# Altium footprint library PCB封装库.PcbLib: 77 footprints (part 1 of 5)
Each footprint in its own frame and in the unit in brackets; x right, y up, seen from the top. Pads: shape width x height; smd on the part's side, far side on the other; paste and mask are expansions set on the pad; w line width, h text height; cw(c..) or ccw(c..) is an arc to the next point about the centre after c.
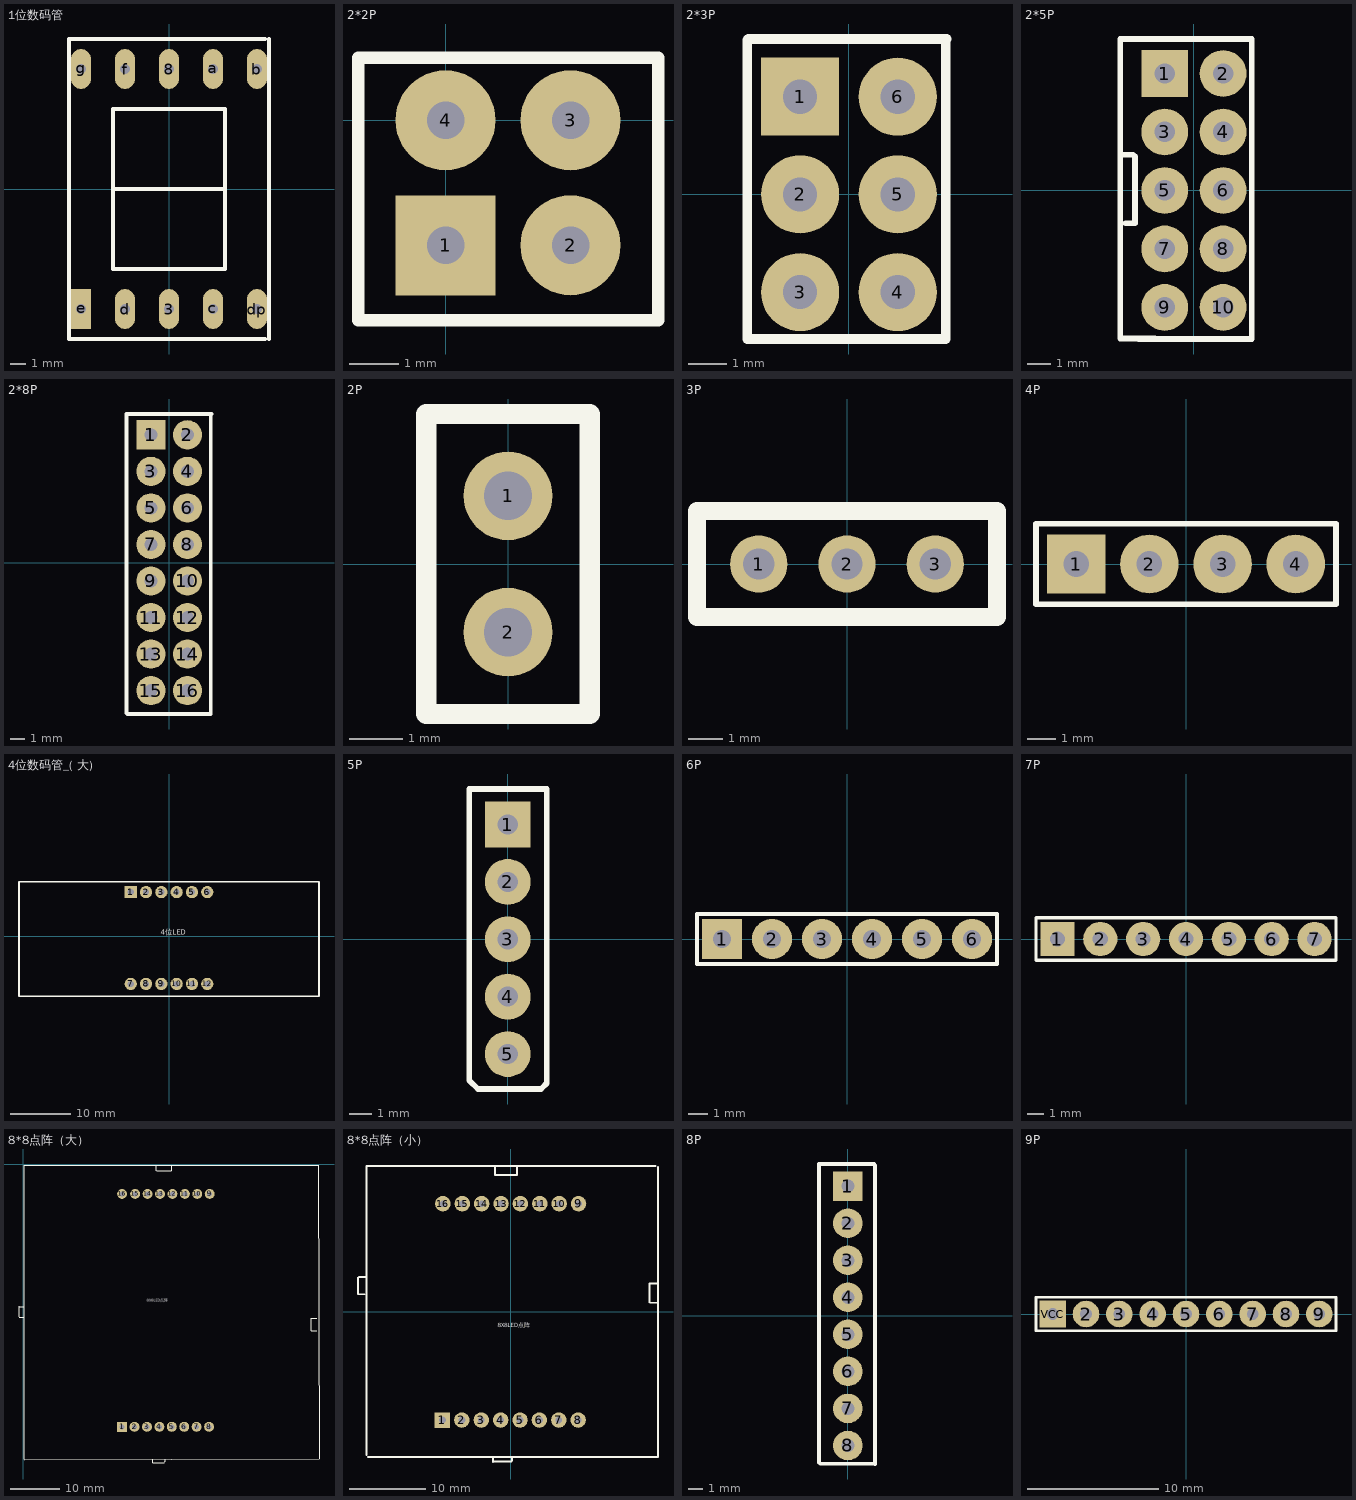
[diagram p0: the footprints below, top view; thin cyan lines are the x and y axes]

## 1位数码管 [mil]
pads (10):
  oval 50x100 hole 25: 3(0,-300) 8(0,300) a(110,300) b(220,300) c(110,-300) d(-110,-300) dp(220,-300) f(-110,300) g(-220,300)
  rect 50x100 hole 25: e(-220,-300)
Top Overlay:
  lines w10: -140,0 140,0 ; 240,-375 -250,-375 -250,375 240,375 ; 250,-375 250,375 ; -140,-200 -140,200 140,200 140,-200 -140,-200

## 2*2P [mil]
pads (4):
  rect 80x80 hole 30: 1(0,-100)
  round 80 hole 30: 2(100,-100) 3(100,0) 4(0,0)
Top Overlay:
  lines w10: -70,-150 -70,50 170,50 170,40 170,-150 ; -70,-130 -70,-160 160,-160 ; -60,-160 160,-160 ; 170,-100 170,-160 160,-160

## 2*3P [mil]
pads (6):
  rect 80x80 hole 35: 1(-50,100)
  round 80 hole 35: 2(-50,0) 3(-50,-100) 4(50,-100) 5(50,0) 6(50,100)
Top Overlay:
  lines w10: -104,-148 99,-148 99,158 100,159 -103,159 -104,158 -104,-148

## 2*5P [mil]
pads (10):
  rect 80x80 hole 35: 1(-50,200)
  round 80 hole 35: 2(50,200) 3(-50,100) 4(50,100) 5(-50,0) 6(50,0) 7(-50,-100) 8(50,-100) 9(-50,-200) 10(50,-200)
Top Overlay:
  lines w10: -126,61 -104,61 -101,58 -101,-56 -117,-56 ; -95,-254 99,-254 99,259 -106,259 -126,259 -126,-253 -106,-253 -67,-253

## 2*8P [mil]
pads (16):
  rect 80x80 hole 35: 1(-50,350)
  round 80 hole 35: 2(50,350) 3(-50,250) 4(50,250) 5(-50,150) 6(50,150) 7(-50,50) 8(50,50) 9(-50,-50) 10(50,-50) 11(-50,-150) 12(50,-150) 13(-50,-250) 14(50,-250) 15(-50,-350) 16(50,-350)
Top Overlay:
  lines w10: -117,-412 -115,-414 114,-414 114,405 116,407 -117,407 -117,-412

## 2P [mm]
pads (2):
  round 1.652 hole 0.9: 1(0,1.27) 2(0,-1.27)
Top Overlay:
  lines w0.381: -1.524,-2.794 -1.524,2.794 -0.762,2.794 1.524,2.794 1.524,-2.794 -1.524,-2.794

## 3P [mm]
pads (3):
  round 1.652 hole 0.9 unplated: 1(-2.54,0) 2(0,0) 3(2.54,0)
Top Overlay:
  lines w0.508: -4.318,-1.524 4.318,-1.524 4.318,1.524 3.81,1.524 -3.81,1.524 -4.318,1.524 -4.318,-1.524

## 4P [mil]
pads (4):
  rect 80x80 hole 35: 1(-150,0)
  round 80 hole 35: 2(-50,0) 3(50,0) 4(150,0)
Top Overlay:
  lines w7.87: -205,-55 205,-55 205,55 -205,55 -205,-55

## 4位数码管_( 大) [mil]
pads (12):
  rect 80x80 hole 40: 1(-250,290)
  round 80 hole 40: 2(-150,290) 3(-50,290) 4(50,290) 5(150,290) 6(250,290) 7(-250,-310) 8(-150,-310) 9(-50,-310) 10(50,-310) 11(150,-310) 12(250,-310)
Top Overlay:
  lines w10: -980,-392 980,-392 980,359 -980,359 -980,-392
  text "4位LED" at -55,-3 h60

## 5P [mil]
pads (5):
  rect 80x80 hole 35: 1(0,200)
  round 80 hole 35: 2(0,100) 3(0,0) 4(0,-100) 5(0,-200)
Top Overlay:
  lines w10: -67,-246 -67,262 68,262 68,-251 60,-259 58,-261 -52,-261 -67,-246

## 6P [mil]
pads (6):
  rect 80x80 hole 35.43: 1(-250,0)
  round 80 hole 35.43: 2(-150,0) 3(-50,0) 4(50,0) 5(150,0) 6(250,0)
Top Overlay:
  lines w7.87: -300,-50 -300,50 300,50 300,-50 -300,-50

## 7P [mil]
pads (7):
  rect 80x80 hole 35.43: 1(-300,0)
  round 80 hole 35.43: 2(-200,0) 3(-100,0) 4(0,0) 5(100,0) 6(200,0) 7(300,0)
Top Overlay:
  lines w7.87: -350,-50 350,-50 350,50 -350,50 -350,-50

## 8*8点阵（大） [mil]
pads (16):
  rect 80x80 hole 40: 1(795,-2115)
  round 80 hole 40: 2(895,-2115) 3(995,-2115) 4(1095,-2115) 5(1195,-2115) 6(1295,-2115) 7(1395,-2115) 8(1495,-2115) 9(1500,-240) 10(1400,-240) 11(1300,-240) 12(1200,-240) 13(1100,-240) 14(1000,-240) 15(900,-240) 16(795,-240)
Top Overlay:
  lines w10: -35,-1230 -35,-1146 ; -35,-1150 3,-1150 ; -33,-1235 0,-1235 ; 7,-2375 7,-1185.04 ; 7,-1189.1 7,-8 2370,-8 ; 8.94,-2380.39 2380.02,-2370.37 2375.04,-10 ; 1040,-2378 1040,-2404 1043,-2406 1134,-2406 1137,-2398 ; 1070,-55 1070,-10 ; 1075,-55 1189,-55 ; 1142,-2398 1142,-2378 ; 1195,-55 1195,-10 ; 2361,-1343 2320,-1343 2317,-1340 2317,-1243 2361,-1243
  text "8X8LED点阵" at 995,-1115 h39.37

## 8*8点阵（小） [mil]
pads (16):
  rect 80x80 hole 35: 1(-351,-558)
  round 80 hole 35: 2(-251,-558) 3(-151,-558) 4(-51,-558) 5(49,-558) 6(149,-558) 7(249,-558) 8(349,-558) 9(351,558) 10(251,558) 11(151,558) 12(51,558) 13(-49,558) 14(-149,558) 15(-249,558) 16(-349,558)
Top Overlay:
  lines w10: -754,91 -787,91 -787,175 -781,181 -743,181 ; -743,-740 -743,-425.04 ; -743,-429.1 -743,752 438.1,752 ; -736.1,-748 445,-748 759.96,-748 759.96,-433.04 ; -90,-748 -90,-774 -87,-771 4,-771 7,-768 7,-748 ; -80,752 -80,707 34,707 34,752 ; 434.04,752 749,752 ; 761,-433.1 761,748 ; 761,47 720,47 717,50 717,147 761,147
  text "8X8LED点阵" at -66,-87 h39.37

## 8P [mil]
pads (8):
  rect 80x80 hole 35: 1(0,350)
  round 80 hole 35: 2(0,250) 3(0,150) 4(0,50) 5(0,-50) 6(0,-150) 7(0,-250) 8(0,-350)
Top Overlay:
  lines w10: -78,-396 -75,-399 67,-399 73,-400 73,407 71,410 -78,410 -78,-396

## 9P [mil]
pads (9):
  round 80 hole 35.43: 2(-300,0) 3(-200,0) 4(-100,0) 5(0,0) 6(100,0) 7(200,0) 8(300,0) 9(400,0)
  rect 80x80 hole 35.43: VCC(-400,0)
Top Overlay:
  lines w7.87: -450,-50 450,-50 450,50 -450,50 -450,-50